# Altium footprint library PCB_LIB.PcbLib: 116 footprints (part 7 of 8)
Each footprint in its own frame and in the unit in brackets; x right, y up, seen from the top. Pads: shape width x height; smd on the part's side, far side on the other; paste and mask are expansions set on the pad; w line width, h text height; cw(c..) or ccw(c..) is an arc to the next point about the centre after c.
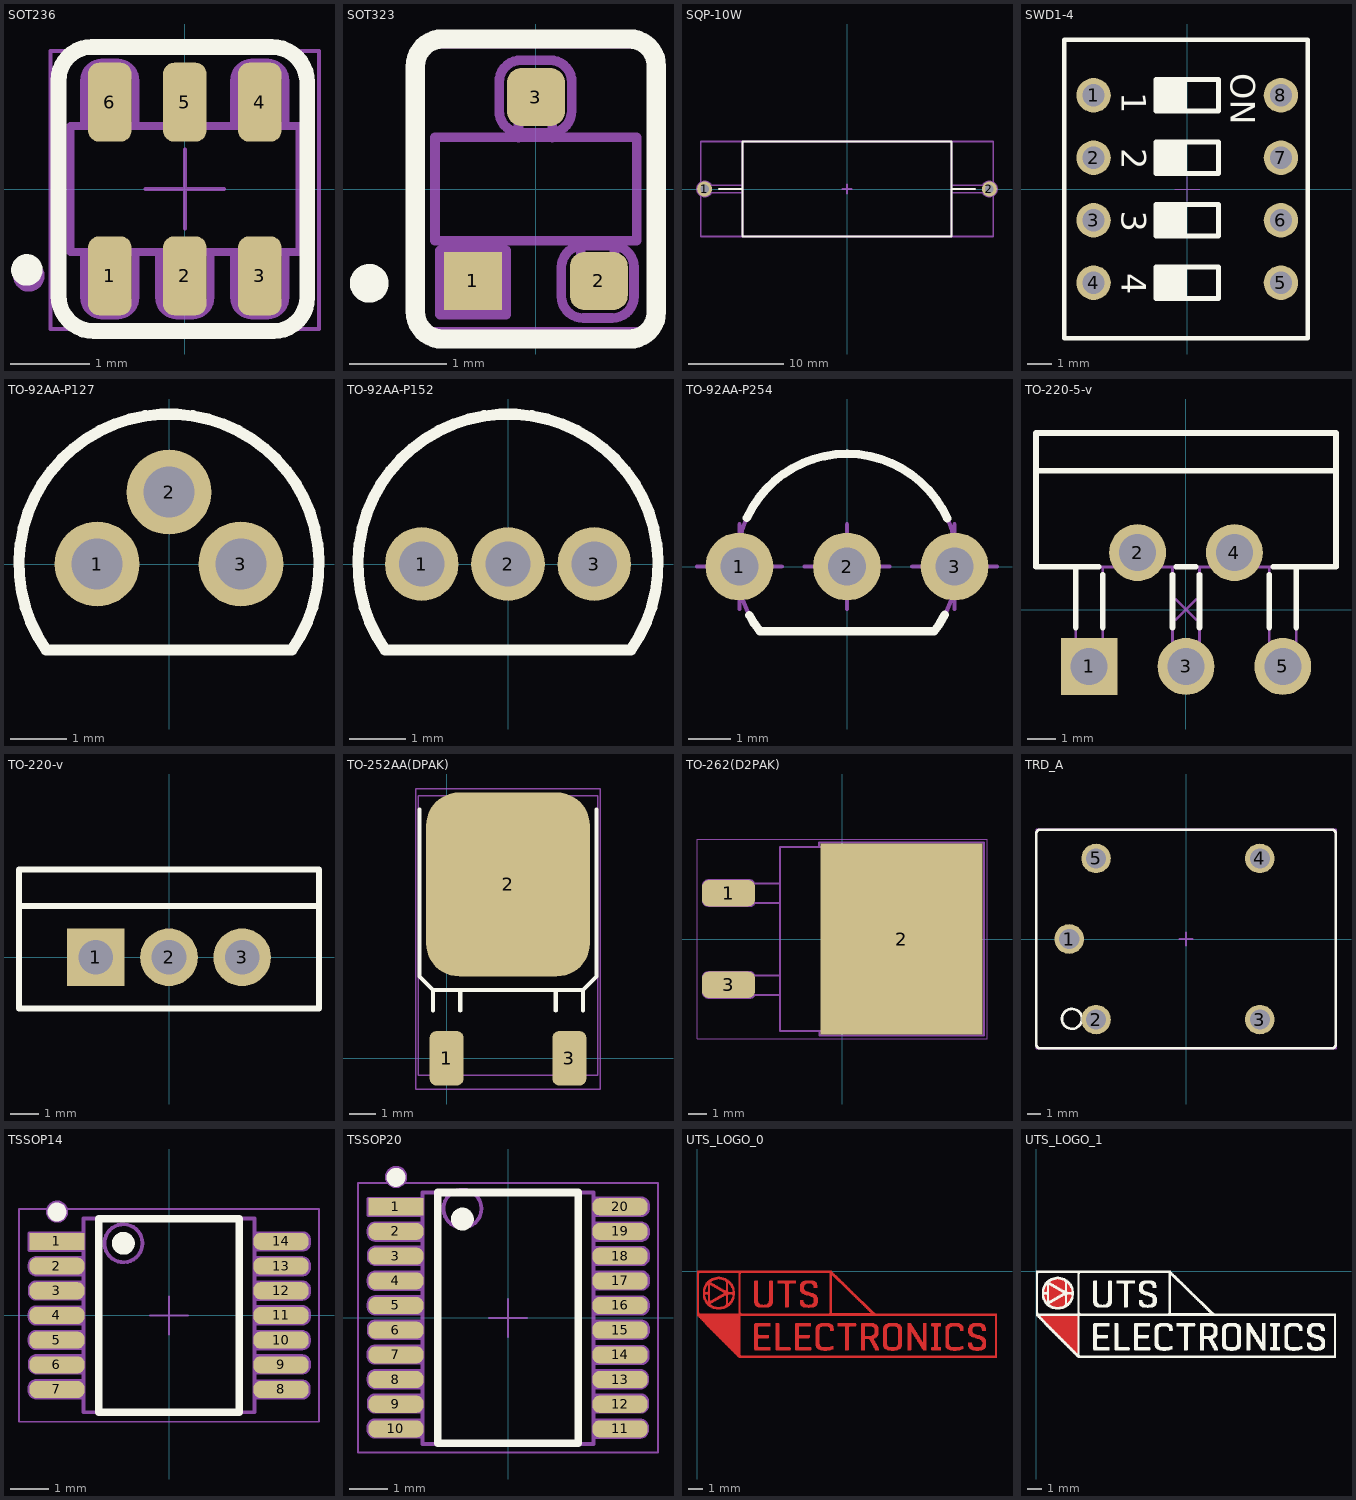
[diagram p6: the footprints below, top view; thin cyan lines are the x and y axes]

## SOT236 [mm] "SOT23, 6-Leads, Body 2.9x1.3mm, Pitch 0.95mm, Lead Span 2.5mm"
height 1.45
pads (6):
  rrect50% 0.55x1 smd: 1(-0.95,-1.1) 2(0,-1.1) 3(0.95,-1.1) 4(0.95,1.1) 5(0,1.1) 6(-0.95,1.1)
Top Overlay:
  circle w0.2: c-2,-1.025 r0.1
  lines w0.2: -1.6,-1.35 ccw(c-1.15,-1.35) -1.15,-1.8 1.125,-1.8 ccw(c1.125,-1.375) 1.55,-1.375 1.55,1.35 ccw(c1.1,1.35) 1.1,1.8 -1.175,1.8 ccw(c-1.175,1.375) -1.6,1.375 -1.6,-0.775 -1.6,-1.35
Mechanical 14:
  circle w0.2: c-1.975,-1.1 r0.1
  lines w0.1: -1.275,-0.8 -1.275,-1.375 ccw(c-1.05,-1.375) -1.05,-1.6 -0.85,-1.6 ccw(c-0.85,-1.375) -0.625,-1.375 -0.625,-0.8 ; -1.275,0.8 -1.275,1.375 cw(c-1.05,1.375) -1.05,1.6 -0.85,1.6 cw(c-0.85,1.375) -0.625,1.375 -0.625,0.8 ; -1.125,-0.8 -1.125,-1.35 -0.775,-1.35 -0.775,-0.8 ; -1.125,0.8 -1.125,1.35 -0.775,1.35 -0.775,0.8 ; -0.325,-0.8 -0.325,-1.375 ccw(c-0.1,-1.375) -0.1,-1.6 0.1,-1.6 ccw(c0.1,-1.375) 0.325,-1.375 0.325,-0.8 ; -0.175,-0.8 -0.175,-1.35 0.175,-1.35 0.175,-0.8 ; 0.625,-0.8 0.625,-1.375 ccw(c0.85,-1.375) 0.85,-1.6 1.05,-1.6 ccw(c1.05,-1.375) 1.275,-1.375 1.275,-0.8 ; 0.625,0.8 0.625,1.375 cw(c0.85,1.375) 0.85,1.6 1.05,1.6 cw(c1.05,1.375) 1.275,1.375 1.275,0.8 ; 0.775,-0.8 0.775,-1.35 1.125,-1.35 1.125,-0.8 ; 0.775,0.8 0.775,1.35 1.125,1.35 1.125,0.8 ; -1.45,-0.8 -1.45,0.8 1.45,0.8 1.45,-0.8 -1.45,-0.8
  text ".Comment" at -2.475,-2.975 h1.5
  text ".Designator" at -3.3,-0.85 h1.6
Mechanical 15:
  lines w0.05: -0.5,0 0.5,0 ; 0,-0.5 0,0.5 ; -1.7,-1.775 -1.7,1.75 1.7,1.75 1.7,-1.775 -1.7,-1.775
3D body "SOT-23-6.STEP": height 1.09, standoff 0, extent -1.397,-1.219 1.397,1.206

## SOT323 [mm] "SOT-323/SC-70; 3 Leads; Body 2.2 x 2.2 mm, inc. leads (LxW max)"
height 1
pads (3):
  rect 0.6x0.6 smd: 1(-0.65,-0.95)
  rrect50% 0.6x0.6 smd: 2(0.65,-0.95) 3(0,0.95)
Top Overlay:
  circle w0.2: c-1.721,-0.974 r0.1
  lines w0.2: -1.245,-1.27 ccw(c-0.965,-1.27) -0.965,-1.549 0.965,-1.549 ccw(c0.965,-1.27) 1.245,-1.27 1.245,1.27 ccw(c0.965,1.27) 0.965,1.549 -0.965,1.549 ccw(c-0.965,1.27) -1.245,1.27 -1.245,-1.27
Mechanical 14:
  lines w0.1: -0.833,-0.533 -0.833,-1.083 -0.483,-1.083 -0.483,-0.533 ; -0.807,-0.584 -0.507,-0.584 ; -0.18,0.531 -0.18,1.081 0.17,1.081 0.17,0.531 ; 0.463,-0.533 0.463,-1.083 0.813,-1.083 0.813,-0.533 ; -0.38,0.807 ccw(c-0.155,0.807) -0.155,0.582 0.145,0.582 ccw(c0.145,0.807) 0.37,0.807 0.37,0.807 0.37,1.106 ccw(c0.145,1.106) 0.145,1.331 -0.155,1.331 ccw(c-0.155,1.106) -0.38,1.106 -0.38,0.807 ; -0.38,0.807 -0.38,0.807 ; 0.263,-0.809 cw(c0.488,-0.809) 0.488,-0.584 0.788,-0.584 cw(c0.788,-0.809) 1.013,-0.809 1.013,-0.809 1.013,-1.108 cw(c0.788,-1.108) 0.788,-1.333 0.488,-1.333 cw(c0.488,-1.108) 0.263,-1.108 0.263,-0.809 ; 0.263,-0.809 0.263,-0.809 ; -1.041,-0.533 1.041,-0.533 1.041,0.533 -1.041,0.533 -1.041,-0.533 ; -0.991,-1.295 -0.305,-1.295 -0.305,-0.635 -0.991,-0.635 -0.991,-0.762 -0.991,-1.295
  text ".Comment" at -4.13,-2.889 h1.5
  text ".Designator" at -4.13,-0.791 h1.2
Mechanical 15:
  lines w0.05: -1.2,-1.45 -1.2,1.475 1.2,1.475 1.2,-1.45 -1.2,-1.45
3D body "SOT323.STEP": height 0.9, standoff 0, extent -1.05,-1.037 1.05,1.063

## SQP-10W [mm]
pads (2):
  round 1.6 hole 0.9: 1(-15,0) 2(15,0)
Top Overlay:
  lines w0.2: -13.5,0 -11,0 ; 11,0 13.5,0 ; -11,-5 11,-5 11,5 -11,5 -11,-5
Mechanical 14:
  lines w0.2: -14.305,-0.397 cw(c-15,0) -14.305,0.397 ; -11,-0.4 -15,-0.4 cw(c-15,0) -15,0.4 -11,0.4 ; 11,-0.4 15,-0.4 ccw(c15,0) 15,0.4 11,0.4 ; 14.305,-0.397 ccw(c15,0) 14.305,0.397 ; -11,-5 -11,5 11,5 11,-5 -11,-5
  text ".Designator" at -8.3,0.6 h4
  text ".Comment" at -5,-3 h3
Mechanical 15:
  lines w0.2: -0.5,0 0.5,0 ; 0,-0.5 0,0.5 ; -15.4,-5 -15.4,5 15.4,5 15.4,-5 -15.4,-5
3D body "RESAR3000W80L2200T1000H900_5W.STEP": height 9, standoff -2.5, extent -15.4,-5 15.4,5

## SWD1-4 [mm] "Body 12.1x7.5mm, 4 Ways SPST DIP Switch, Thru Hole, TYCO AD Series"
height 5.5
pads (8):
  round 1.4 hole 0.9: 1(-3.81,3.81) 2(-3.81,1.27) 3(-3.81,-1.27) 4(-3.81,-3.81) 5(3.81,-3.81) 6(3.81,-1.27) 7(3.81,1.27) 8(3.81,3.81)
Top Overlay:
  region: -1.27,-0.635 -1.27,-1.905 0,-1.905 0,-0.635
  region: -1.27,-3.175 -1.27,-4.445 0,-4.445 0,-3.175
  region: -1.27,1.905 -1.27,0.635 0,0.635 0,1.905
  region: -1.27,4.445 -1.27,3.175 0,3.175 0,4.445
  lines w0.2: -5,-6.071 -5,6 -5,6.071 -3.746,6.071 3.746,6.071 4.9,6.071 4.9,-6.071 3.746,-6.071 -3.746,-6.071 -5,-6.071 ; -1.27,-4.445 1.27,-4.445 1.27,-3.175 -1.27,-3.175 -1.27,-4.445 ; -1.27,-1.905 1.27,-1.905 1.27,-0.635 -1.27,-0.635 -1.27,-1.905 ; -1.27,0.635 1.27,0.635 1.27,1.905 -1.27,1.905 -1.27,0.635 ; -1.27,3.175 -1.27,4.445 1.27,4.445 1.27,3.175 -1.27,3.175
  text "ON" at 1.778,4.699 h1
  text "4" at -2.667,-3.429 h1
  text "2" at -2.667,1.651 h1
  text "3" at -2.667,-0.889 h1
  text "1" at -2.667,3.937 h1
Mechanical 14:
  region: -1.27,4.445 -1.27,3.175 0,3.175 0,4.445
  region: -1.27,-0.635 -1.27,-1.905 0,-1.905 0,-0.635
  region: -1.27,1.905 -1.27,0.635 0,0.635 0,1.905
  region: -1.27,-3.175 -1.27,-4.445 0,-4.445 0,-3.175
  lines w0.1: -5,-6.071 -5,6.071 4.9,6.071 4.9,-6.071 -5,-6.071 ; -1.27,-4.445 1.27,-4.445 1.27,-3.175 -1.27,-3.175 -1.27,-4.445 ; -1.27,-1.905 1.27,-1.905 1.27,-0.635 -1.27,-0.635 -1.27,-1.905 ; -1.27,0.635 1.27,0.635 1.27,1.905 -1.27,1.905 -1.27,0.635 ; -1.27,3.175 -1.27,4.445 1.27,4.445 1.27,3.175 -1.27,3.175
  text "ON" at 1.778,4.699 h1
  text "4" at -2.667,-3.429 h1
  text "2" at -2.667,1.651 h1
  text "3" at -2.667,-0.889 h1
  text "1" at -2.667,3.937 h1
Mechanical 15:
  lines w0.05: -0.5,0 0.5,0 ; 0,-0.5 0,0.5 ; -5,-6.1 -5,6.1 4.9,6.1 4.9,-6.1 -5,-6.1
3D body "User Library-DIP SW 4P TH.step": height 8.5, standoff -3.8, extent -4.89,-6.21 4.89,6.21

## TO-92AA-P127 [mm] "TO-92 (TO-226),  Pitch 1.27mm, Flat Index, 3 In-Line, Axial Leads, Body Dia. 5.3mm, Leads Dia. 0.5mm (max)"
height 5.33
pads (3):
  round 1.5 hole 0.9: 1(-1.27,0) 2(0,1.27) 3(1.27,0)
Top Overlay:
  lines w0.2: -2.171,-1.52 cw(c0,0) 2.171,-1.52 -2.171,-1.52
Mechanical 14:
  lines w0.1: -2.171,-1.52 cw(c0,0) 2.171,-1.52 -2.171,-1.52
3D body "TO-92AA-P127.stp": height 9.33, standoff -3.2, extent -2.579,-1.53 2.579,2.638

## TO-92AA-P152 [mm] "TO-92 (TO-226),  Pitch 1.524mm, Flat Index, 3 In-Line, Axial Leads, Body Dia. 5.3mm, Leads Dia. 0.5mm (max)"
height 5.33
pads (3):
  round 1.3 hole 0.8: 1(-1.524,0) 2(0,0) 3(1.524,0)
Top Overlay:
  lines w0.2: -2.171,-1.52 cw(c0,0) 2.171,-1.52 -2.171,-1.52
Mechanical 14:
  lines w0.1: -2.171,-1.52 cw(c0,0) 2.171,-1.52 -2.171,-1.52
3D body "TO-92AA-P152.stp": height 9.33, standoff -3.2, extent -2.587,-1.53 2.588,2.66

## TO-92AA-P254 [mm] "TO-92 (TO226), Pitch 2.54mm, Flat Index, 3 In-Line, Bent Leads, Body Dia. 5.3mm"
height 9.33
pads (3):
  round 1.6 hole 0.9: 1(-2.54,0) 2(0,0) 3(2.54,0)
Top Overlay:
  lines w0.2: -2.363,1.145 cw(c0,0.059) 2.369,1.133 ; -2.302,-1.151 ccw(c0,0.059) -2.059,-1.53 2.059,-1.53 ccw(c0,0.059) 2.307,-1.141
Mechanical 8:
  lines w0.1: -3.54,0 -2.54,0 ; -2.54,-1 -2.54,0 ; -2.54,1 -2.54,0 ; -1.54,0 -2.54,0 ; -1,0 0,0 ; 0,-1 0,0 ; 0,1 0,0 ; 1,0 0,0 ; 1.54,0 2.54,0 ; 2.54,-1 2.54,0 ; 2.54,1 2.54,0 ; 3.54,0 2.54,0
Mechanical 14:
  lines w0.1: -2.059,-1.53 cw(c0,0.059) 2.059,-1.53 -2.059,-1.53
3D body "TO-92AA-P254.stp": height 9.33, standoff -3.2, extent -2.81,-1.53 2.81,2.638

## TO-220-5-v [mm] "TO-220 5-Terminal - Vertical Mount"
height 15.57
pads (5):
  rect 2x2 hole 1.3: 1(-3.4,-2)
  round 2 hole 1.3: 2(-1.7,2) 3(0,-2) 4(1.7,2) 5(3.4,-2)
Top Overlay:
  lines w0.2: -5.27,4.88 5.27,4.88 ; -3.875,-0.63 -3.875,1.5 ; -3.061,1.5 -5.27,1.5 -5.27,6.2 5.27,6.2 5.27,1.5 3.061,1.5 ; -2.925,-0.63 -2.925,1.224 ; -0.475,-0.63 -0.475,1.224 ; -0.339,1.5 0.339,1.5 ; 0.475,-0.63 0.475,1.224 ; 2.925,-0.63 2.925,1.224 ; 3.875,-0.63 3.875,1.5
Mechanical 8:
  lines w0.1: -3.9,-2 -3.4,-2 ; -3.4,-2.5 -3.4,-2 ; -3.4,-1.5 -3.4,-2 ; -2.9,-2 -3.4,-2 ; -2.2,2 -1.7,2 ; -1.7,1.5 -1.7,2 ; -1.7,2.5 -1.7,2 ; -1.2,2 -1.7,2 ; -0.5,-2 0,-2 ; -0.353,-0.354 0,0 ; -0.353,0.354 0,0 ; 0,-2.5 0,-2 ; 0,-1.5 0,-2 ; 0.354,-0.354 0,0 ; 0.354,0.354 0,0 ; 0.5,-2 0,-2 ; 1.2,2 1.7,2 ; 1.7,1.5 1.7,2 ; 1.7,2.5 1.7,2 ; 2.2,2 1.7,2 ; 2.9,-2 3.4,-2 ; 3.4,-2.5 3.4,-2 ; 3.4,-1.5 3.4,-2 ; 3.9,-2 3.4,-2
Mechanical 14:
  lines w0.1: -5.27,4.88 5.27,4.88 ; -3.875,1.5 -3.875,-2.32 -2.925,-2.32 -2.925,1.5 ; -0.475,1.5 -0.475,-2.32 0.475,-2.32 0.475,1.5 ; 2.925,1.5 2.925,-2.32 3.875,-2.32 3.875,1.5 ; -5.27,1.5 -5.27,6.2 5.27,6.2 5.27,1.5 -5.27,1.5
3D body "TO-220-5-V.stp": height 21.79, standoff -3.8, extent -5.27,-2.32 5.27,6.2

## TO-220-v [mm] "TO-220 3-Terminal - Vertical Mount"
height 22.86
pads (3):
  rect 2x2 hole 1.2: 1(-2.54,0)
  round 2 hole 1.2: 2(0,0) 3(2.54,0)
Top Overlay:
  lines w0.2: -5.207,1.778 5.207,1.778 ; -5.207,-1.778 5.207,-1.778 5.207,3.048 -5.207,3.048 -5.207,-1.778
Mechanical 14:
  lines w0.1: -5.207,1.778 5.207,1.778 ; -5.207,-1.778 5.207,-1.778 5.207,3.048 -5.207,3.048 -5.207,-1.778
3D body "TO-220-V.stp": height 20.5, standoff -3.5, extent -5.27,-1.75 5.27,2.95

## TO-252AA(DPAK) [mil]
pads (3):
  rrect40% 50x80 smd: 1(0,0) 3(180,0)
  rrect40% 240x270 smd: 2(90,255)
Top Overlay:
  lines w6: -40,365 -40,120 -20,100 ; -20,70 -20,100 ; 20,70 20,100 ; 160,70 160,100 ; 200,70 200,100 ; 220,365 220,120 200,100 ; -20,100 200,100
Mechanical 13:
  lines w2: -42,-25 222,-25 222,385 -42,385 -42,-25
Mechanical 14:
  lines w2: -45,-45 -45,395 225,395 225,-45 -45,-45
3D body "TO-252.STEP": height 90.56, standoff -4.52, extent -38.73,-16.77 218.75,374.5

## TO-262(D2PAK) [mm] "D2PAK TO-263, TO, 2.54mm pitch; 3 pin, 13.945mm L X 8.89mm W X 4.57mm H body, IPC Medium Density"
height 4.57
pads (3):
  rrect50% 2.95x1.45 smd: 1(-6.3,2.54) 3(-6.3,-2.54)
  rect 9x10.6 smd: 2(3.3,0)
Top Paste:
  region: 5.74,3.3 7.1,3.3 7.1,4.7 5.74,4.7
  region: 3.66,3.3 5.02,3.3 5.02,4.7 3.66,4.7
  region: 1.58,3.3 2.94,3.3 2.94,4.7 1.58,4.7
  region: -0.5,3.3 0.86,3.3 0.86,4.7 -0.5,4.7
  region: 5.74,1.3 7.1,1.3 7.1,2.7 5.74,2.7
  region: 3.66,1.3 5.02,1.3 5.02,2.7 3.66,2.7
  region: 1.58,1.3 2.94,1.3 2.94,2.7 1.58,2.7
  region: -0.5,1.3 0.86,1.3 0.86,2.7 -0.5,2.7
  region: 5.74,-0.7 7.1,-0.7 7.1,0.7 5.74,0.7
  region: 3.66,-0.7 5.02,-0.7 5.02,0.7 3.66,0.7
  region: 1.58,-0.7 2.94,-0.7 2.94,0.7 1.58,0.7
  region: -0.5,-0.7 0.86,-0.7 0.86,0.7 -0.5,0.7
  region: 5.74,-2.7 7.1,-2.7 7.1,-1.3 5.74,-1.3
  region: 3.66,-2.7 5.02,-2.7 5.02,-1.3 3.66,-1.3
  region: 1.58,-2.7 2.94,-2.7 2.94,-1.3 1.58,-1.3
  region: -0.5,-2.7 0.86,-2.7 0.86,-1.3 -0.5,-1.3
  region: 5.74,-4.7 7.1,-4.7 7.1,-3.3 5.74,-3.3
  region: 3.66,-4.7 5.02,-4.7 5.02,-3.3 3.66,-3.3
  region: 1.58,-4.7 2.94,-4.7 2.94,-3.3 1.58,-3.3
  region: -0.5,-4.7 0.86,-4.7 0.86,-3.3 -0.5,-3.3
Mechanical 14:
  lines w0.1: -7.725,-2.95 -7.725,-2.15 cw(c-7.399,-2.15) -7.399,-1.824 -5.175,-1.824 ; -7.726,-2.949 ccw(c-7.4,-2.949) -7.4,-3.275 -5.15,-3.275 ; -7.725,2.15 -7.725,2.95 cw(c-7.399,2.95) -7.399,3.276 -5.175,3.276 ; -7.726,2.151 ccw(c-7.4,2.151) -7.4,1.825 -5.15,1.825 ; -5.15,-1.825 cw(c-5.15,-2.151) -4.868,-1.988 ; -5.15,3.275 cw(c-5.15,2.949) -4.868,3.112 ; -5.126,-3.276 ccw(c-5.126,-2.95) -4.844,-3.113 ; -5.126,1.824 ccw(c-5.126,2.15) -4.844,1.987 ; -3.438,-3.1 -7.55,-3.1 -7.55,-2.025 -3.438,-2.025 ; -3.438,2 -7.55,2 -7.55,3.075 -3.438,3.075 ; -1.275,5.11 -1.275,5.35 7.875,5.35 7.875,-5.35 -1.25,-5.35 -1.25,-5.11 ; 5.452,-5.11 5.954,-5.11 6.972,-3.982 6.972,3.982 5.954,5.11 5.452,5.11 ; -3.438,-5.11 5.453,-5.11 5.453,5.11 -3.438,5.11 -3.438,-5.11
  text ".Designator" at 2.625,5.15 h2.5
  text ".Comment" at -1.65,5.15 h1.5
Mechanical 15:
  lines w0.05: -0.5,0 0.5,0 ; 0,-0.5 0,0.5 ; -8.05,-5.55 8.05,-5.55 8.05,5.55 -8.05,5.55 -8.05,-5.55
3D body "TO254P1524X483-3N.stp": height 4.83, standoff 0, extent -7.622,-5.08 7.623,5.08

## TRD_A [mm] "5 Leads Relay, Row Spacing 12 mm; Body 22mm x 16mm, JS Serie"
height 16.3
pads (5):
  round 2.2 hole 1.5: 1(-8.7,0) 2(-6.7,-6) 3(5.5,-6) 4(5.5,6) 5(-6.7,6)
Top Overlay:
  circle w0.2: c-8.5,-5.95 r0.743
  lines w0.2: -11.15,-7.85 ccw(c-10.85,-7.85) -10.85,-8.15 10.85,-8.15 ccw(c10.85,-7.85) 11.15,-7.85 11.15,7.85 ccw(c10.85,7.85) 10.85,8.15 -10.85,8.15 ccw(c-10.85,7.85) -11.15,7.85 -11.15,-7.85
Mechanical 14:
  circle w0.1: c-8.5,-5.95 r0.743
  lines w0.127: -11.15,-7.85 ccw(c-10.85,-7.85) -10.85,-8.15 10.85,-8.15 ccw(c10.85,-7.85) 11.15,-7.85 11.15,7.85 ccw(c10.85,7.85) 10.85,8.15 -10.85,8.15 ccw(c-10.85,7.85) -11.15,7.85 -11.15,-7.85
  text ".Designator" at -5.525,1.65 h2.5
  text ".Comment" at -11.15,-4.85 h2.5
Mechanical 15:
  lines w0.1: -11.175,-8.175 11.175,-8.175 11.175,8.175 -11.175,8.175 -11.175,-8.175
  lines w0.127: -9.2,0 -8.7,0 ; -8.7,-0.5 -8.7,0 ; -8.7,0.5 -8.7,0 ; -8.2,0 -8.7,0 ; -7.2,-6 -6.7,-6 ; -7.2,6 -6.7,6 ; -6.7,-6.5 -6.7,-6 ; -6.7,-5.5 -6.7,-6 ; -6.7,5.5 -6.7,6 ; -6.7,6.5 -6.7,6 ; -6.2,-6 -6.7,-6 ; -6.2,6 -6.7,6 ; -0.5,0 0,0 ; 0,-0.5 0,0 ; 0,0.5 0,0 ; 0.5,0 0,0 ; 5,-6 5.5,-6 ; 5,6 5.5,6 ; 5.5,-6.5 5.5,-6 ; 5.5,-5.5 5.5,-6 ; 5.5,5.5 5.5,6 ; 5.5,6.5 5.5,6 ; 6,-6 5.5,-6 ; 6,6 5.5,6
3D body "REL_PANASONIC_JS1.stp": height 16.7, standoff -3.5, extent -11.15,-8.15 11.15,8.15

## TSSOP14 [mm] "SOP, 14-Leads, Body 5.1x4.5mm (max), Pitch 0.65mm, IPC Medium Density"
height 1.2
pads (14):
  rect 1.45x0.45 smd: 1(-2.95,1.95)
  rrect80% 1.45x0.45 smd: 2(-2.95,1.3) 3(-2.95,0.65) 4(-2.95,0) 5(-2.95,-0.65) 6(-2.95,-1.3) 7(-2.95,-1.95) 8(2.95,-1.95) 9(2.95,-1.3) 10(2.95,-0.65) 11(2.95,0) 12(2.95,0.65) 13(2.95,1.3) 14(2.95,1.95)
Top Overlay:
  circle w0.3: c-1.2,1.9 r0.15
  circle w0.25: c-2.95,2.725 r0.125
  lines w0.2: -1.85,-2.55 1.85,-2.55 1.85,2.55 -1.85,2.55 -1.85,-2.55
Mechanical 14:
  circle w0.1: c-1.2,1.9 r0.5
  circle w0.3: c-2.946,2.735 r0.141
  lines w0.1: -2.266,-1.726 -3.496,-1.726 ccw(c-3.496,-1.904) -3.673,-1.904 -3.673,-1.983 ccw(c-3.496,-1.983) -3.496,-2.161 -2.261,-2.161 ; -2.264,-0.43 -3.494,-0.43 ccw(c-3.494,-0.608) -3.672,-0.608 -3.672,-0.687 ccw(c-3.494,-0.687) -3.494,-0.865 -2.259,-0.865 ; -2.264,0.217 -3.494,0.217 ccw(c-3.494,0.039) -3.672,0.039 -3.672,-0.04 ccw(c-3.494,-0.04) -3.494,-0.218 -2.259,-0.218 ; -2.262,1.513 -3.492,1.513 ccw(c-3.492,1.335) -3.67,1.335 -3.67,1.256 ccw(c-3.492,1.256) -3.492,1.078 -2.257,1.078 ; -2.26,-1.068 -3.49,-1.068 ccw(c-3.49,-1.246) -3.668,-1.246 -3.668,-1.325 ccw(c-3.49,-1.325) -3.49,-1.502 -2.255,-1.502 ; -2.258,-1.814 -3.17,-1.814 -3.17,-2.07 -2.256,-2.07 ; -2.259,0.875 -3.488,0.875 ccw(c-3.488,0.697) -3.666,0.697 -3.666,0.618 ccw(c-3.488,0.618) -3.488,0.441 -2.253,0.441 ; -2.256,-0.518 -3.168,-0.518 -3.168,-0.774 -2.254,-0.774 ; -2.256,0.129 -3.168,0.129 -3.168,-0.127 -2.254,-0.127 ; -2.254,1.425 -3.166,1.425 -3.166,1.169 -2.252,1.169 ; -2.252,-1.156 -3.165,-1.156 -3.165,-1.411 -2.25,-1.411 ; -2.252,2.07 -3.157,2.07 -3.157,1.814 -2.25,1.814 ; -2.251,0.787 -3.163,0.787 -3.163,0.532 -2.249,0.532 ; -2.25,1.725 -3.675,1.725 -3.675,2.16 -2.25,2.16 ; 2.264,-1.826 3.178,-1.826 3.178,-2.082 2.266,-2.082 ; 2.266,-0.525 3.18,-0.525 3.18,-0.78 2.268,-0.78 ; 2.268,-1.735 3.503,-1.735 cw(c3.503,-1.913) 3.681,-1.913 3.681,-1.992 cw(c3.503,-1.992) 3.503,-2.17 2.274,-2.17 ; 2.268,1.418 3.182,1.418 3.182,1.163 2.27,1.163 ; 2.27,-1.163 3.184,-1.163 3.184,-1.418 2.272,-1.418 ; 2.271,-0.434 3.506,-0.434 cw(c3.506,-0.612) 3.684,-0.612 3.684,-0.691 cw(c3.506,-0.691) 3.506,-0.869 2.276,-0.869 ; 2.272,0.133 3.186,0.133 3.186,-0.122 2.273,-0.122 ; 2.272,0.78 3.186,0.78 3.186,0.525 2.274,0.525 ; 2.273,1.509 3.508,1.509 cw(c3.508,1.331) 3.686,1.331 3.686,1.252 cw(c3.508,1.252) 3.508,1.074 2.278,1.074 ; 2.273,2.076 3.187,2.076 3.187,1.821 2.275,1.821 ; 2.275,-1.072 3.51,-1.072 cw(c3.51,-1.249) 3.687,-1.249 3.687,-1.328 cw(c3.51,-1.328) 3.51,-1.506 2.28,-1.506 ; 2.276,0.224 3.511,0.224 cw(c3.511,0.046) 3.689,0.046 3.689,-0.033 cw(c3.511,-0.033) 3.511,-0.21 2.282,-0.21 ; 2.276,0.871 3.512,0.871 cw(c3.512,0.694) 3.689,0.694 3.689,0.615 cw(c3.512,0.615) 3.512,0.437 2.282,0.437 ; 2.278,2.167 3.513,2.167 cw(c3.513,1.989) 3.691,1.989 3.691,1.91 cw(c3.513,1.91) 3.513,1.733 2.283,1.733 ; -2.25,-2.55 2.25,-2.55 2.25,2.55 -2.25,2.55 -2.25,-2.55
  text ".Comment" at -2.465,-4.119 h1.5
  text ".Designator" at 0.769,-4.222 h2
Mechanical 15:
  lines w0.05: -0.5,0 0.5,0 ; 0,-0.5 0,0.5 ; -3.95,-2.8 3.95,-2.8 3.95,2.8 -3.95,2.8 -3.95,-2.8
3D body "SOP65P640X120-14N.stp": height 1.2, standoff 0, extent -3.121,-2.55 3.121,2.55

## TSSOP20 [mm] "SOP, 20-Leads, Body 6.6x4.5mm (max), Pitch 0.65mm, IPC Medium Density"
height 1.1
pads (20):
  rect 1.45x0.45 smd: 1(-2.95,2.925)
  rrect80% 1.45x0.45 smd: 2(-2.95,2.275) 3(-2.95,1.625) 4(-2.95,0.975) 5(-2.95,0.325) 6(-2.95,-0.325) 7(-2.95,-0.975) 8(-2.95,-1.625) 9(-2.95,-2.275) 10(-2.95,-2.925) 11(2.95,-2.925) 12(2.95,-2.275) 13(2.95,-1.625) 14(2.95,-0.975) 15(2.95,-0.325) 16(2.95,0.325) 17(2.95,0.975) 18(2.95,1.625) 19(2.95,2.275) 20(2.95,2.925)
Top Overlay:
  circle w0.3: c-1.2,2.6 r0.15
  circle w0.25: c-2.95,3.7 r0.125
  lines w0.2: -1.85,-3.3 -1.85,3.3 1.85,3.3 1.85,-3.3 -1.85,-3.3
Mechanical 14:
  drawing of 164 lines, arcs and shapes, not listed
  text ".Comment" at -2.465,-5.144 h1.5
  text ".Designator" at 0.769,-3.247 h2
Mechanical 15:
  lines w0.05: -0.5,0 0.5,0 ; 0,-0.5 0,0.5 ; -3.95,-3.55 -3.95,3.55 3.95,3.55 3.95,-3.55 -3.95,-3.55
3D body "SOP65P640X110-20N.stp": height 1.19, standoff 0, extent -3.121,-3.3 3.121,3.3

## UTS_LOGO_0 [mm] "Логотип УТС"
Top Layer:
  drawing of 2408 lines, arcs and shapes, not listed
Top Solder:
  circle w1.1: c1.448,-1.448 r0.55

## UTS_LOGO_1 [mm] "Логотип УТС"
Top Layer:
  circle w1: c1.448,-1.448 r0.5
  pour cut-out: 2.8,-5.7 2.8,-3 0.2,-3
Top Overlay:
  drawing of 2407 lines, arcs and shapes, not listed
Top Solder:
  circle w1: c1.448,-1.448 r0.5